# Altium footprint library Intelliclone.PcbLib: 372 footprints (part 9 of 24)
Each footprint in its own frame and in the unit in brackets; x right, y up, seen from the top. Pads: shape width x height; smd on the part's side, far side on the other; paste and mask are expansions set on the pad; w line width, h text height; cw(c..) or ccw(c..) is an arc to the next point about the centre after c.
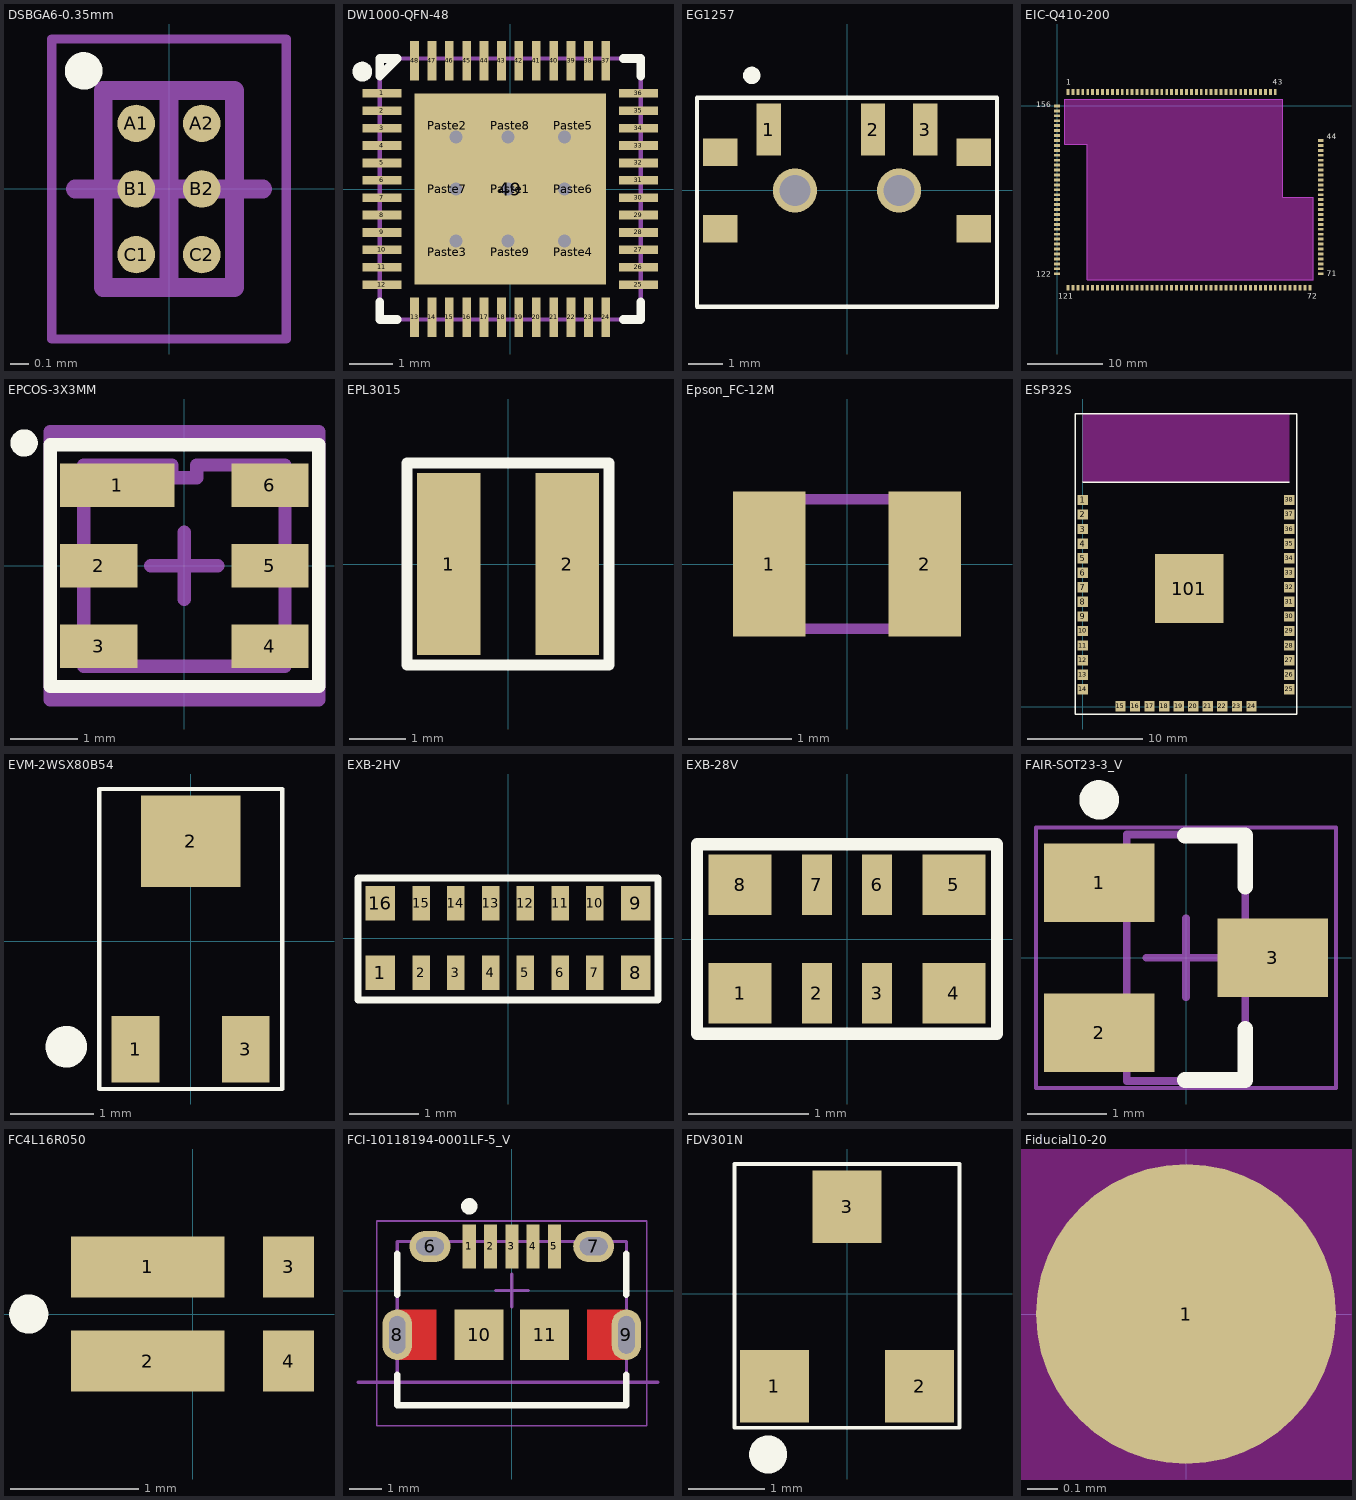
[diagram p8: the footprints below, top view; thin cyan lines are the x and y axes]

## DSBGA6-0.35mm [mm] "BGA, 6-Leads, Body 0.70x1.05mmx0.40mm, Pitch 0.35mm"
height 0.4
pads (6):
  round 0.2 smd: A1(-0.175,0.35) A2(0.175,0.35) B1(-0.175,0) B2(0.175,0) C1(-0.175,-0.35) C2(0.175,-0.35)
Top Overlay:
  circle w0.1: c-0.455,0.63 r0.05
Mechanical 13:
  lines w0.1: -0.35,-0.525 0.35,-0.525 0.35,0.525 -0.35,0.525 -0.35,-0.525
Mechanical 15:
  lines w0.05: -0.625,-0.8 0.625,-0.8 0.625,0.8 -0.625,0.8 -0.625,-0.8
  lines w0.1: -0.5,0 0.5,0 ; 0,-0.5 0,0.5
3D body "BGA6C35P2X3_70X105X40.step": height 0.4, standoff 0, extent -0.35,-0.525 0.35,0.525

## DW1000-QFN-48 [mm] "DW1000 48 Pin QFN"
pads (58):
  rect 0.9x0.2 smd mask+0.05: 1(-2.95,2.2) 2(-2.95,1.8) 3(-2.95,1.4) 4(-2.95,1) 5(-2.95,0.6) 6(-2.95,0.2) 7(-2.95,-0.2) 8(-2.95,-0.6) 9(-2.95,-1) 10(-2.95,-1.4) 11(-2.95,-1.8) 12(-2.95,-2.2) 25(2.95,-2.2) 26(2.95,-1.8) 27(2.95,-1.4) 28(2.95,-1) 29(2.95,-0.6) 30(2.95,-0.2) 31(2.95,0.2) 32(2.95,0.6) 33(2.95,1) 34(2.95,1.4) 35(2.95,1.8) 36(2.95,2.2)
  rect 0.2x0.9 smd mask+0.05: 13(-2.2,-2.95) 14(-1.8,-2.95) 15(-1.4,-2.95) 16(-1,-2.95) 17(-0.6,-2.95) 18(-0.2,-2.95) 19(0.2,-2.95) 20(0.6,-2.95) 21(1,-2.95) 22(1.4,-2.95) 23(1.8,-2.95) 24(2.2,-2.95) 37(2.2,2.95) 38(1.8,2.95) 39(1.4,2.95) 40(1,2.95) 41(0.6,2.95) 42(0.2,2.95) 43(-0.2,2.95) 44(-0.6,2.95) 45(-1,2.95) 46(-1.4,2.95) 47(-1.8,2.95) 48(-2.2,2.95)
  rect 4.4x4.4 smd paste-4.4 mask+0.05: 49(0,0)
  rect 1.3x1.3 on Top Paste mask+0.05: Paste1(0,0) Paste2(-1.45,1.45) Paste3(-1.45,-1.45) Paste4(1.45,-1.45) Paste5(1.45,1.45) Paste6(1.45,0) Paste7(-1.45,0) Paste8(0,1.45) Paste9(0,-1.45)
via -0.05,1.2 diameter 0.6 hole 0.3
via -0.05,0 diameter 0.6 hole 0.3
via 1.25,0 diameter 0.6 hole 0.3
via -1.25,0 diameter 0.6 hole 0.3
via -1.25,-1.2 diameter 0.6 hole 0.3
via -0.05,-1.2 diameter 0.6 hole 0.3
via 1.25,-1.2 diameter 0.6 hole 0.3
via -1.25,1.2 diameter 0.6 hole 0.3
via 1.25,1.2 diameter 0.6 hole 0.3
Top Overlay:
  circle w0.254: c-3.4,2.7 r0.1
  lines w0.2: -3,-2.6 -3,-3 -2.6,-3 ; 2.6,-3 3,-3 3,-2.6 ; 2.6,3 3,3 3,2.6 ; -3,2.6 -3,3 -2.6,3 -3,2.6
Mechanical 13:
  lines w0.1: -3,-3 -3,3 3,3 3,-3 -3,-3
  text ".Designator" at -2.921,3.937 h0.8
3D body: height 1, standoff 0, extent -3,-3 3,3

## EG1257 [mm]
height 2.54
pads (9):
  rect 0.7x1.5 smd: 1(-2.25,1.75) 2(0.75,1.75) 3(2.25,1.75)
  rect 1x0.8 smd: ""(-3.65,-1.1) ""(-3.65,1.1) ""(3.65,-1.1) ""(3.65,1.1)
  round 1.27 hole 0.9: ""(-1.5,0) ""(1.5,0)
Top Overlay:
  circle w0.25: c-2.741,3.311 r0.125
  lines w0.127: -4.318,-3.353 -4.318,2.667 4.318,2.667 4.318,-3.353 -4.318,-3.353
3D body: height 1.4, standoff 0.1, extent -4.318,-1.778 4.318,2.667
3D body: height 1.09, standoff 0.1, extent 0.127,-3.264 1.422,-1.765

## EIC-Q410-200 [mil] "e-Infochips Q410 SOM"
height 78.74
pads (156):
  rect 15x30 smd: 1(57.09,73.23) 2(82.9,73.23) 3(108.71,73.23) 4(134.52,73.23) 5(160.33,73.23) 6(186.14,73.23) 7(211.95,73.23) 8(237.76,73.23) 9(263.57,73.23) 10(289.39,73.23) 11(315.2,73.23) 12(341.01,73.23) 13(366.82,73.23) 14(392.63,73.23) 15(418.44,73.23) 16(444.25,73.23) 17(470.06,73.23) 18(495.87,73.23) 19(521.68,73.23) 20(547.5,73.23) 21(573.31,73.23) 22(599.12,73.23) 23(624.93,73.23) 24(650.74,73.23) 25(676.55,73.23) 26(702.36,73.23) 27(728.17,73.23) 28(753.98,73.23) 29(779.79,73.23) 30(805.61,73.23) 31(831.42,73.23) 32(857.23,73.23) 33(883.04,73.23) 34(908.85,73.23) 35(934.66,73.23) 36(960.47,73.23) 37(986.28,73.23) 38(1012.09,73.23) 39(1037.9,73.23) 40(1063.72,73.23) 41(1089.53,73.23) 42(1115.34,73.23) 43(1141.15,73.23) 72(1321.83,-950.8) 73(1296.01,-950.8) 74(1270.2,-950.8) 75(1244.39,-950.8) 76(1218.58,-950.8) 77(1192.77,-950.8) 78(1166.96,-950.8) 79(1141.15,-950.8) 80(1115.34,-950.8) 81(1089.53,-950.8) 82(1063.72,-950.8) 83(1037.9,-950.8) 84(1012.09,-950.8) 85(986.28,-950.8) 86(960.47,-950.8) 87(934.66,-950.8) 88(908.85,-950.8) 89(883.04,-950.8) 90(857.23,-950.8) 91(831.42,-950.8) 92(805.61,-950.8) 93(779.79,-950.8) 94(753.98,-950.8) 95(728.17,-950.8) 96(702.36,-950.8) 97(676.55,-950.8) 98(650.74,-950.8) 99(624.93,-950.8) 100(599.12,-950.8) 101(573.31,-950.8) 102(547.5,-950.8) 103(521.68,-950.8) 104(495.87,-950.8) 105(470.06,-950.8) 106(444.25,-950.8) 107(418.44,-950.8) 108(392.63,-950.8) 109(366.82,-950.8) 110(341.01,-950.8) 111(315.2,-950.8) 112(289.39,-950.8) 113(263.57,-950.8) 114(237.76,-950.8) 115(211.95,-950.8) 116(186.14,-950.8) 117(160.33,-950.8) 118(134.52,-950.8) 119(108.71,-950.8) 120(82.9,-950.8) 121(57.09,-950.8)
  rect 30x15 smd: 44(1378.91,-180.68) 45(1378.91,-206.49) 46(1378.91,-232.3) 47(1378.91,-258.11) 48(1378.91,-283.92) 49(1378.91,-309.73) 50(1378.91,-335.54) 51(1378.91,-361.35) 52(1378.91,-387.17) 53(1378.91,-412.98) 54(1378.91,-438.79) 55(1378.91,-464.6) 56(1378.91,-490.41) 57(1378.91,-516.22) 58(1378.91,-542.03) 59(1378.91,-567.84) 60(1378.91,-593.65) 61(1378.91,-619.46) 62(1378.91,-645.27) 63(1378.91,-671.09) 64(1378.91,-696.9) 65(1378.91,-722.71) 66(1378.91,-748.52) 67(1378.91,-774.33) 68(1378.91,-800.14) 69(1378.91,-825.95) 70(1378.91,-851.76) 71(1378.91,-877.57) 122(0,-877.57) 123(0,-851.76) 124(0,-825.95) 125(0,-800.14) 126(0,-774.33) 127(0,-748.52) 128(0,-722.71) 129(0,-696.9) 130(0,-671.09) 131(0,-645.27) 132(0,-619.46) 133(0,-593.65) 134(0,-567.84) 135(0,-542.03) 136(0,-516.22) 137(0,-490.41) 138(0,-464.6) 139(0,-438.79) 140(0,-412.98) 141(0,-387.17) 142(0,-361.35) 143(0,-335.54) 144(0,-309.73) 145(0,-283.92) 146(0,-258.11) 147(0,-232.3) 148(0,-206.49) 149(0,-180.68) 150(0,-154.87) 151(0,-129.06) 152(0,-103.24) 153(0,-77.43) 154(0,-51.62) 155(0,-25.81) 156(0,0)
Top Overlay:
  text "156" at -110.24,-18.7 h49.21
  text "122" at -109.93,-903.54 h49.21
  text "121" at 5.91,-1018.7 h49.21
  text "72" at 1307.09,-1018.7 h49.21
  text "71" at 1409.45,-900.59 h49.21
  text "44" at 1409.45,-184.06 h49.21
  text "43" at 1128.94,100.39 h49.21
  text "1" at 47.24,99.85 h49.21
Keep-Out Layer:
  board cut-out: 39.37,-201.77 39.37,34.45 1181.1,34.45 1181.1,-477.36 1338.58,-477.36 1338.58,-910.43 157.48,-910.43 157.48,-201.77
Keep-Out Layer:
  lines w5: 39.37,-201.77 157.48,-201.77 157.48,-910.43 1338.58,-910.43 1338.58,-477.36 1181.1,-477.36 1181.1,34.45 39.37,34.45 39.37,-201.77
Mechanical 14:
  lines w5: 39.37,-201.77 157.48,-201.77 157.48,-910.43 1338.58,-910.43 1338.58,-477.36 1181.1,-477.36 1181.1,34.45 39.37,34.45 39.37,-201.77
3D body "Q410_SOM_05Nov15.STEP": height 102.1, standoff -20.95, extent 0.98,-947.83 1378.94,75.79

## EPCOS-3X3MM [mm]
pads (6):
  rect 1.7x0.65 smd paste-0.275: 1(-1,1.2)
  rect 1.15x0.65 smd: 2(-1.275,0) 3(-1.275,-1.2) 4(1.275,-1.2) 5(1.275,0) 6(1.275,1.2)
Top Overlay:
  circle w0.254: c-2.388,1.829 r0.076
  lines w0.2: 2,1.8 2,-1.8 -2,-1.8 -2,1.8 2.007,1.8
Mechanical 13:
  lines w0.2: -1.5,-1.5 -1.5,1.5 -0.188,1.5 -0.188,1.312 0.188,1.312 0.188,1.5 1.5,1.5 1.5,-1.5 -1.5,-1.5
Mechanical 16:
  lines w0.2: -0.5,0 0,0 ; 0,-0.5 0,0 ; 0,0.5 0,0 ; 0.5,0 0,0 ; -2,-2 -2,2 2,2 2,-2 -2,-2
3D body: height 1.1, standoff 0, extent -1.5,-1.5 1.5,1.5

## EPL3015 [mm]
pads (2):
  rect 1.12x3.2 smd: 1(-1.04,0) 2(1.04,0)
Top Overlay:
  lines w0.2: -1.778,-1.778 1.778,-1.778 1.778,1.778 -1.778,1.778 -1.778,-1.778
3D body: height 1.5, standoff 0.1, extent -1.524,-1.524 1.524,1.524

## Epson_FC-12M [mm] "Epson"
height 0.6
pads (2):
  rect 0.7x1.4 smd: 1(-0.75,0) 2(0.75,0)
Mechanical 5:
  lines w0.1: -1.05,-0.625 -1.05,0.625 1.05,0.625 1.05,-0.625 -1.05,-0.625
  text ".Designator" at 0.457,0.254 h0.51
3D body: height 0.6, standoff 0, extent -1.05,-0.625 1.05,0.625

## ESP32S [mm] "ESP32S-Module"
height 2.8
pads (39):
  rect 0.9x0.9 smd: 1(0,18.034) 2(0,16.764) 3(0,15.494) 4(0,14.224) 5(0,12.954) 6(0,11.684) 7(0,10.414) 8(0,9.144) 9(0,7.874) 10(0,6.604) 11(0,5.334) 12(0,4.064) 13(0,2.794) 14(0,1.524) 15(3.3,0.034) 16(4.57,0.034) 17(5.84,0.034) 18(7.11,0.034) 19(8.38,0.034) 20(9.65,0.034) 21(10.92,0.034) 22(12.19,0.034) 23(13.46,0.034) 24(14.73,0.034) 25(18.034,1.524) 26(18.034,2.794) 27(18.034,4.064) 28(18.034,5.334) 29(18.034,6.604) 30(18.034,7.874) 31(18.034,9.144) 32(18.034,10.414) 33(18.034,11.684) 34(18.034,12.954) 35(18.034,14.224) 36(18.034,15.494) 37(18.034,16.764) 38(18.034,18.034)
  rect 6x6 smd: 101(9.3,10.3)
Top Overlay:
  lines w0.127: 0,19.558 18.034,19.558 ; -0.635,-0.635 -0.635,25.527 18.669,25.527 18.669,-0.635 -0.635,-0.635
Keep-Out Layer:
  rectangle: 0,19.558 18.034,25.527
3D body "KiCAD-ESP-WROOM-32.step": height 3.04, standoff 0, extent -0.035,0.01 18.035,25.55

## EVM-2WSX80B54 [mm]
height 1.35
pads (3):
  rect 0.575x0.8 smd: 1(-0.663,-1.3) 3(0.663,-1.3)
  rect 1.199x1.1 smd: 2(0,1.2)
Top Overlay:
  circle w0.25: c-1.497,-1.27 r0.125
  lines w0.051: -1.1,-1.778 -1.1,1.829 1.1,1.829 1.1,-1.778 -1.1,-1.778
3D body: height 1.52, standoff 0.1, extent -1.1,-1.374 1.1,1.374

## EXB-2HV [mm]
pads (16):
  rect 0.425x0.5 smd: 1(-1.837,-0.5) 8(1.837,-0.5) 9(1.837,0.5) 16(-1.837,0.5)
  rect 0.25x0.5 smd: 2(-1.25,-0.5) 3(-0.75,-0.5) 4(-0.25,-0.5) 5(0.25,-0.5) 6(0.75,-0.5) 7(1.25,-0.5) 10(1.25,0.5) 11(0.75,0.5) 12(0.25,0.5) 13(-0.25,0.5) 14(-0.75,0.5) 15(-1.25,0.5)
Top Overlay:
  lines w0.102: -2.159,-0.889 -2.159,0.864 2.159,0.864 2.159,-0.889 -2.159,-0.889
3D body: height 0.55, standoff 0.1, extent -1.905,-0.813 1.905,0.787

## EXB-28V [mm]
pads (8):
  rect 0.525x0.5 smd: 1(-0.887,-0.45) 4(0.887,-0.45) 5(0.887,0.45) 8(-0.887,0.45)
  rect 0.25x0.5 smd: 2(-0.25,-0.45) 3(0.25,-0.45) 6(0.25,0.45) 7(-0.25,0.45)
Top Overlay:
  lines w0.102: -1.245,-0.787 1.245,-0.787 1.245,0.787 -1.245,0.787 -1.245,-0.787
3D body: height 0.45, standoff 0.1, extent -1.041,-0.533 1.041,0.559

## FAIR-SOT23-3_V [mm] "SOT23, 3-Leads, Body 3.12x1.5mm, Pitch 0.95mm"
height 1.2
pads (3):
  rect 1.4x1 smd: 1(-1.1,0.95) 2(-1.1,-0.95) 3(1.1,0)
Top Overlay:
  circle w0.25: c-1.1,2 r0.125
  lines w0.2: -0.013,-1.55 0.75,-1.55 0.75,-0.9 ; -0.013,1.55 0.75,1.55 0.75,0.9
Mechanical 13:
  lines w0.1: -0.75,-1.56 0.75,-1.56 0.75,1.56 -0.75,1.56 -0.75,-1.56
Mechanical 15:
  lines w0.05: -1.9,-1.65 1.9,-1.65 1.9,1.65 -1.9,1.65 -1.9,-1.65
  lines w0.1: -0.5,0 0.5,0 ; 0,-0.5 0,0.5
3D body "SOT95P240X120-3L.step": height 1.2, standoff 0, extent -1.35,-1.56 1.35,1.56

## FC4L16R050 [mm] "RES 0.05 OHM 1/4W 0604 WIDE w/ Kelvin pad"
pads (4):
  rect 1.2x0.475 smd: 1(-0.35,0.367) 2(-0.35,-0.367)
  rect 0.4x0.475 smd: 3(0.75,0.367) 4(0.75,-0.367)
Top Overlay:
  lines w0.152: -1.204,0 cw(c-1.28,0) -1.204,0.003
3D body "FC4L16R050FER.stp": height 0.5, standoff 0, extent -0.724,-0.394 0.876,0.394

## FCI-10118194-0001LF-5_V [mm] "SMD, 5-Leads, Body 7x5mm, Pitch 0.65 mm"
height 2.673
pads (11):
  rect 0.4x1.35 smd: 1(-1.3,1.35) 2(-0.65,1.35) 3(0,1.35) 4(0.65,1.35) 5(1.3,1.35)
  oval 1.25x0.95 hole 0.55 slot 0.85 at 0 deg: 6(-2.5,1.35) 7(2.5,1.35)
  oval 0.9x1.55 hole 0.5 slot 1.15 at 90 deg: 8(-3.5,-1.35) 9(3.5,-1.35)
  rect 1.5x1.55 smd: 10(-1,-1.35) 11(1,-1.35)
Top Layer:
  region: -2.3,-2.125 -2.3,-0.575 -3.5,-0.575 -3.5,-2.125
  region: 3.5,-2.125 3.5,-0.575 2.3,-0.575 2.3,-2.125
Top Overlay:
  circle w0.25: c-1.3,2.575 r0.125
  lines w0.2: -3.5,-2.575 -3.5,-3.5 3.5,-3.5 3.5,-2.575 ; -3.5,-0.125 -3.5,1.13 ; 3.5,-0.125 3.5,1.13
Mechanical 6:
  lines w0.1: -4.7,-2.8 4.465,-2.8
  text "PCB EDGE" at -7.2,-2.9 h0.3
Mechanical 13:
  lines w0.1: -3.5,-3.5 3.5,-3.5 3.5,1.5 -3.5,1.5 -3.5,-3.5
Mechanical 15:
  lines w0.05: -4.125,-4.13 4.125,-4.13 4.125,2.125 -4.125,2.125 -4.125,-4.13
  lines w0.1: -0.5,0 0.5,0 ; 0,-0.5 0,0.5
3D body "10118194c.stp": height 2.72, standoff -0.55, extent -4.025,-4.03 4.025,1.55

## FDV301N [mm]
pads (3):
  rect 0.9x0.95 smd: 1(-0.95,-1.207) 2(0.95,-1.207) 3(0,1.143)
Top Overlay:
  circle w0.25: c-1.034,-2.103 r0.125
  lines w0.051: -1.473,-1.753 -1.473,1.702 1.473,1.702 1.473,-1.753 -1.473,-1.753
3D body: height 1.27, standoff 0.1, extent -1.3,-1.524 1.3,1.372

## Fiducial10-20 [mm]
pads (1):
  round 1 smd mask+0.5: 1(0,0)
Top Layer keep-out:
  circle w1.178: c0,0 r0.5